# Altium footprint library PcbLib_Discrete.PcbLib: 118 footprints (part 7 of 8)
Each footprint in its own frame and in the unit in brackets; x right, y up, seen from the top. Pads: shape width x height; smd on the part's side, far side on the other; paste and mask are expansions set on the pad; w line width, h text height; cw(c..) or ccw(c..) is an arc to the next point about the centre after c.
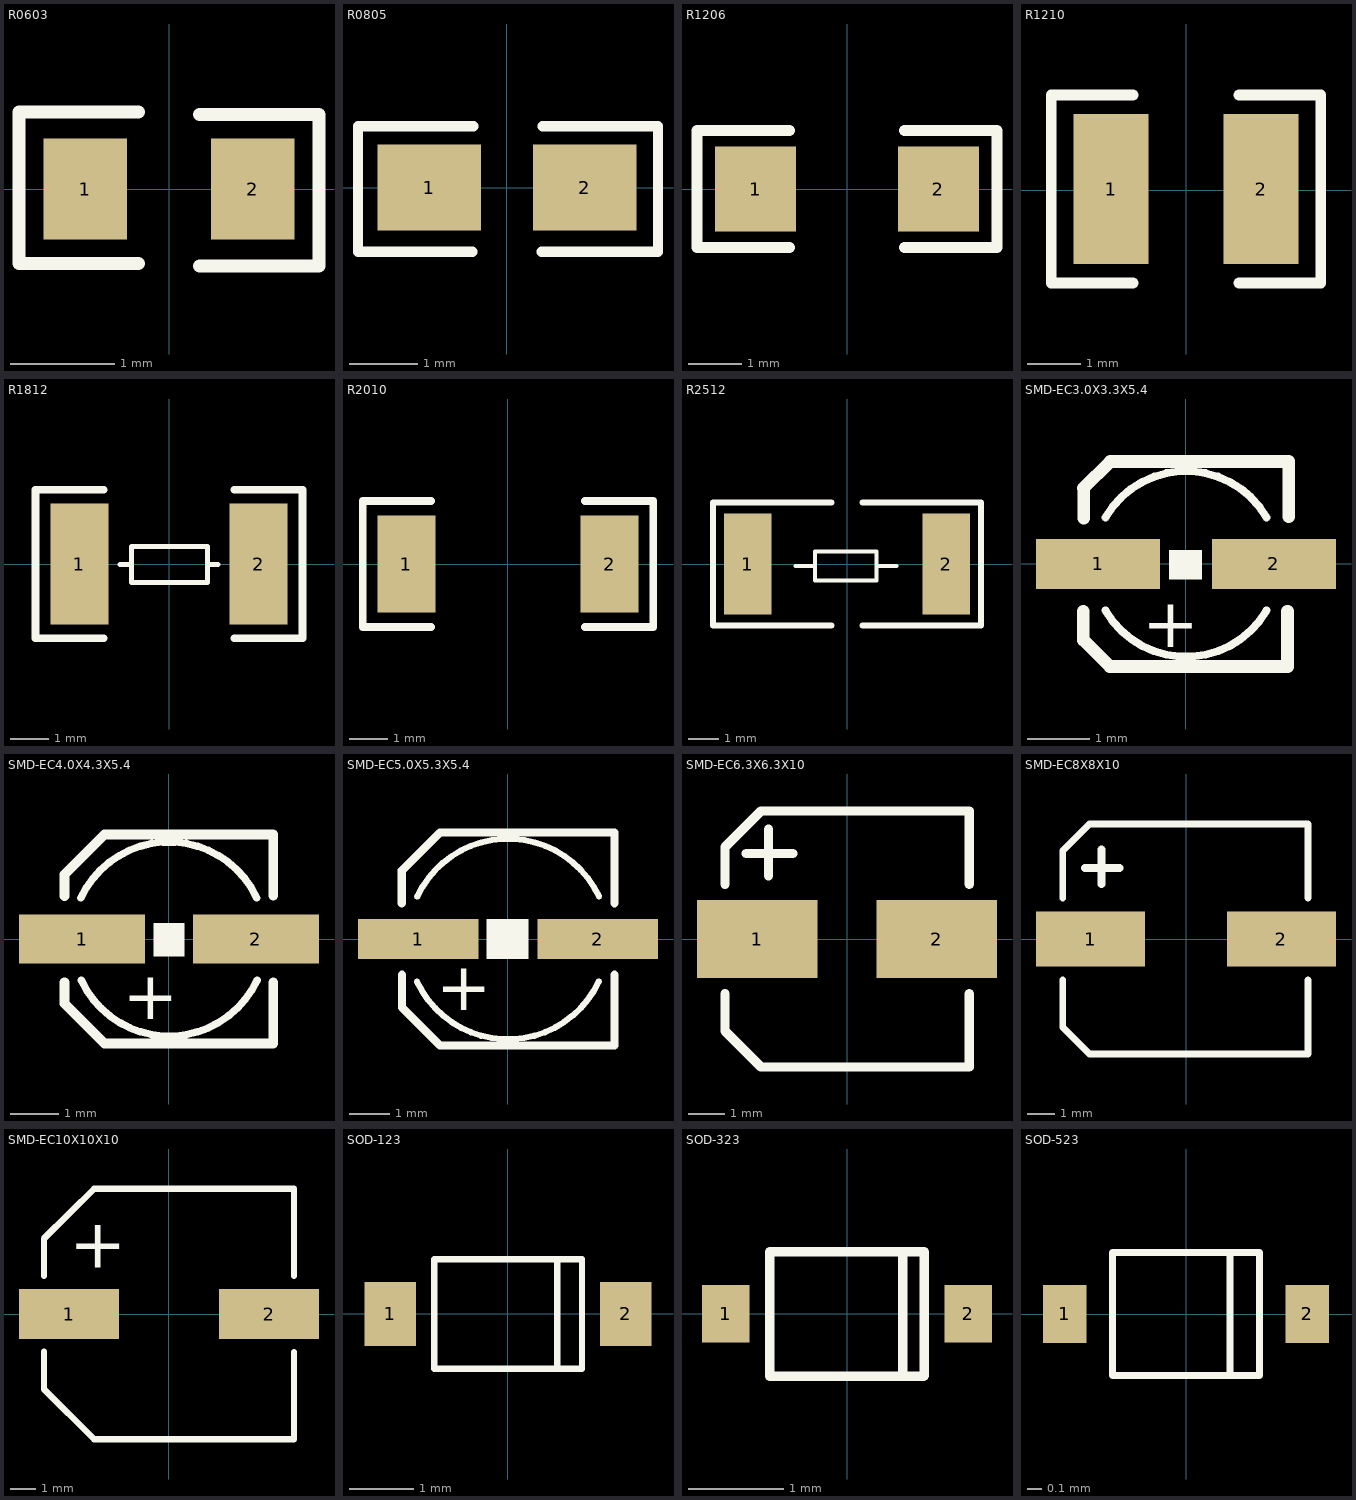
[diagram p6: the footprints below, top view; thin cyan lines are the x and y axes]

## R0603 [mm] "1/10W (0.1W)"
pads (2):
  rect 0.8x0.965 smd: 1(-0.8,0) 2(0.8,0)
Top Overlay:
  lines w0.127: -1.435,-0.712 -0.292,-0.712 ; -1.435,-0.7 -1.435,0.737 -0.292,0.737 ; 0.292,-0.737 1.435,-0.737 1.435,0.7 ; 0.292,0.712 1.435,0.712
3D body "RESC-0603-Black.STEP": height 0.56, standoff 0, extent -0.9,-0.45 0.8,0.45

## R0805 [mil] "1/8W (0.125W)"
pads (2):
  rect 60x50 smd: 1(-45,0) 2(45,0)
Top Overlay:
  lines w6: -20,-37.13 -86.34,-37.13 -86.34,35.43 -19.41,35.43 ; 20,-37.13 86.93,-37.13 ; 20.59,35.43 87.52,35.43 87.52,-37.13
3D body "RESC-0805-Black.STEP": height 24.02, standoff 0, extent -44.01,-26.57 38.67,26.58

## R1206 [mil] "1/4W (0.25W)"
pads (2):
  rect 60x62.99 smd: 1(-67.5,0) 2(67.5,0)
Top Overlay:
  lines w8: -42.5,-43.31 -110.81,-43.31 -110.81,43.31 -42.5,43.31 ; 42.5,-43.31 110.81,-43.31 110.81,43.31 42.5,43.31
3D body "RESC-1206-Black.STEP": height 25.98, standoff 0, extent -65.52,-32.87 64.4,34.06

## R1210 [mm] "1/2W (0.5W)，1/3W (0.33W)"
height 1.45
pads (2):
  rect 1.4x2.8 smd: 1(-1.4,0.025) 2(1.4,0.025)
Top Overlay:
  lines w0.203: -0.991,-1.728 -2.515,-1.728 -2.515,1.778 -0.991,1.778 ; 0.991,-1.728 2.515,-1.728 2.515,1.778 0.991,1.778
3D body "RESC-1210-Black.STEP": height 0.61, standoff 0, extent -1.65,-1.35 1.65,1.35

## R1812 [mil] "1/2W (0.5W)，3/4W (0.75W)"
pads (2):
  rect 60x125 smd: 1(-92.5,0) 2(92.5,0)
Top Overlay:
  lines w5.12: -50.5,-0.61 -38.87,-0.61 ; 39.87,-0.61 50.5,-0.61 ; -38.87,-19.31 -38.87,18.09 39.87,18.09 39.87,-19.31 -38.87,-19.31
  lines w8: -67.5,-76.77 -138,-76.77 -138,76.77 -67.5,76.77 ; 67.5,-76.77 138,-76.77 138,76.77 67.5,76.77
3D body "User Library-Resistors1812.STEP": height 24.11, standoff -0.49, extent -97.07,-63.49 82.06,63.48

## R2010 [mm] "3/4W (0.75W)"
pads (2):
  rect 1.52x2.54 smd: 1(-2.665,0) 2(2.665,0)
Top Overlay:
  lines w0.203: -2.017,-1.651 -3.808,-1.651 -3.808,1.651 -2.017,1.651 ; 2.017,-1.651 3.808,-1.651 3.808,1.651 2.017,1.651
3D body "2010R.STEP": height 0.47, standoff 0, extent -2.498,-1.251 2.502,1.251

## R2512 [mil] "1W, 2W, ＞2W"
pads (2):
  rect 61x129.92 smd: 1(-127.5,0) 2(127.5,0)
Top Overlay:
  lines w5.12: -66.35,-2.61 -40.76,-2.61 ; 37.98,-2.61 63.57,-2.61 ; -40.76,-21.31 37.98,-21.31 37.98,16.09 -40.76,16.09 -40.76,-21.31
  lines w8: -20,-78.74 -171.78,-78.74 -171.78,78.74 -20,78.74 ; 20,-78.74 171.78,-78.74 171.78,78.74 20,78.74
3D body "R2512-2.STEP": height 27.56, standoff 0, extent -129.92,-66.93 129.92,66.93

## SMD-EC3.0X3.3X5.4 [mm]
pads (2):
  rect 2x0.8 smd: 1(-1.417,0) 2(1.417,0)
Top Overlay:
  rectangle: -0.274,-0.254 0.259,0.229
  lines w0.127: -1.3,-0.747 ccw(c-0.001,0.003) 1.298,-0.747 ; -1.298,0.747 cw(c0.001,-0.003) 1.3,0.747
  lines w0.203: -1.657,-1.229 -1.657,-0.762 ; -1.652,-1.229 -1.227,-1.653 1.642,-1.653 ; -1.652,1.222 -1.227,1.646 ; -1.646,0.737 -1.646,1.222 ; -1.222,1.651 1.648,1.651 ; 1.636,-1.653 1.636,-0.762 ; 1.654,0.76 1.654,1.651
  text "+" at -0.706,-1.346 h0.8
3D body "ALU-A_3.0x3.3x5.4.STEP": height 5.4, standoff 0, extent -1.82,-1.649 1.78,1.651

## SMD-EC4.0X4.3X5.4 [mm]
pads (2):
  rect 2.6x1 smd: 1(-1.789,0) 2(1.789,0)
Top Overlay:
  rectangle: -0.316,-0.356 0.319,0.33
  lines w0.152: -1.815,0.846 cw(c-0.003,0) 1.81,0.846 ; -1.81,-0.846 ccw(c0.003,0) 1.815,-0.846
  lines w0.203: -2.154,-0.889 -2.154,-1.324 -1.328,-2.15 2.147,-2.15 2.147,-0.889 ; -2.154,0.889 -2.154,1.325 -1.328,2.151 2.147,2.151 2.147,0.89
  text "+" at -0.951,-1.651 h1
3D body "ALU-B_4.0x4.3x5.4.STEP": height 5.4, standoff 0, extent -2.311,-2.15 2.288,2.15

## SMD-EC5.0X5.3X5.4 [mm]
pads (2):
  rect 3x1 smd: 1(-2.238,0) 2(2.238,0)
Top Overlay:
  rectangle: -0.537,-0.5 0.505,0.5
  lines w0.152: -2.269,-1.057 ccw(c-0.003,0) 2.263,-1.057 ; -2.263,1.057 cw(c0.003,0) 2.269,1.057
  lines w0.203: -2.647,0.891 -2.647,1.708 ; -2.645,-0.889 -2.645,-1.706 ; -2.645,1.707 -1.697,2.655 ; -2.021,-2.33 -2.645,-1.706 ; 2.651,0.891 2.651,2.656 -1.696,2.656 ; 2.653,-2.654 2.653,-0.889 ; 2.653,-2.654 -1.696,-2.654 -1.697,-2.654 -2.645,-1.706 ; -1.697,2.655 -1.696,2.656
  text "+" at -1.794,-1.777 h1.2
3D body "ALU-C_5.0x5.3x5.4.STEP": height 5.41, standoff 0, extent -2.966,-2.65 2.934,2.65

## SMD-EC6.3X6.3X10 [mm]
pads (2):
  rect 3.3x2.132 smd: 1(-2.45,0) 2(2.45,0)
Top Overlay:
  lines w0.254: -3.335,-1.498 -3.335,-2.515 -2.35,-3.5 3.34,-3.5 3.34,-1.498 ; -3.335,1.498 -3.335,2.515 -2.35,3.5 3.34,3.5 3.34,1.498 ; -2.756,2.337 -1.486,2.337 ; -2.147,1.727 -2.147,2.997
3D body "ALU-D_6.3x6.6x5.4.STEP": height 5.4, standoff 0, extent -3.5,-3.3 3.5,3.3

## SMD-EC8X8X10 [mm]
pads (2):
  rect 4x2 smd: 1(-3.5,0) 2(3.5,0)
Top Overlay:
  lines w0.254: -4.52,-1.499 -4.52,-3.235 -3.546,-4.209 4.476,-4.209 4.476,-1.499 ; -4.52,1.499 -4.52,3.235 -3.546,4.209 4.476,4.209 4.476,1.499
  lines w0.3: -3.703,2.6 -2.433,2.6 ; -3.094,2.016 -3.094,3.286
3D body "ALU-F_8.0x8.3x10.2.STEP": height 10.2, standoff 0, extent -4.95,-4.15 4.95,4.15

## SMD-EC10X10X10 [mm]
pads (2):
  rect 4x2 smd: 1(-4,0) 2(4,0)
Top Overlay:
  lines w0.254: -4.999,-1.505 -4.999,-3.004 -2.997,-5.004 5,-5.004 5,-1.524 ; -4.999,1.524 -4.999,3.023 -2.997,5.004 5,5.004 ; 0,5.004 5,5.004 ; 5,1.524 5,5.004
  text "+" at -3.988,1.854 h2
3D body "ALU-G_10.0x10.3x10.2.STEP": height 10.2, standoff 0, extent -5.736,-5.15 5.864,5.15

## SOD-123 [mm] "塑封二极管"
pads (2):
  rect 0.8x1 smd: 1(-1.829,0) 2(1.829,0)
Top Overlay:
  lines w0.1: 0.762,-0.85 0.762,0.85 ; -1.143,-0.85 1.149,-0.85 1.149,0.85 -1.143,0.85 -1.143,-0.85
3D body "SOD-123_DiodesInc.STEP": height 1.43, standoff -0.02, extent -1.9,-0.889 1.95,0.811

## SOD-323 [mm] "塑封二极管"
pads (2):
  rect 0.5x0.6 smd: 1(-1.27,0) 2(1.27,0)
Top Overlay:
  lines w0.1: 0.584,-0.651 0.584,0.649 ; 0.805,-0.649 0.803,-0.651 -0.81,-0.651 -0.81,0.649 0.81,0.649 0.81,-0.649
3D body "SOD323.STEP": height 0.9, standoff -0.09, extent -1.25,-0.625 1.25,0.625

## SOD-523 [mm] "塑封二极管"
pads (2):
  rect 0.3x0.4 smd: 1(-0.838,0) 2(0.838,0)
Top Overlay:
  lines w0.05: 0.305,-0.425 0.305,0.425 ; -0.508,-0.425 0.508,-0.425 0.508,0.425 -0.508,0.425 -0.508,-0.425
3D body "SOD-523.STEP": height 0.65, standoff 0, extent -0.8,-0.407 0.8,0.393